# Altium schematic symbol library LATTICEPLDS_Library.SchLib: 291 symbols (part 20 of 32)
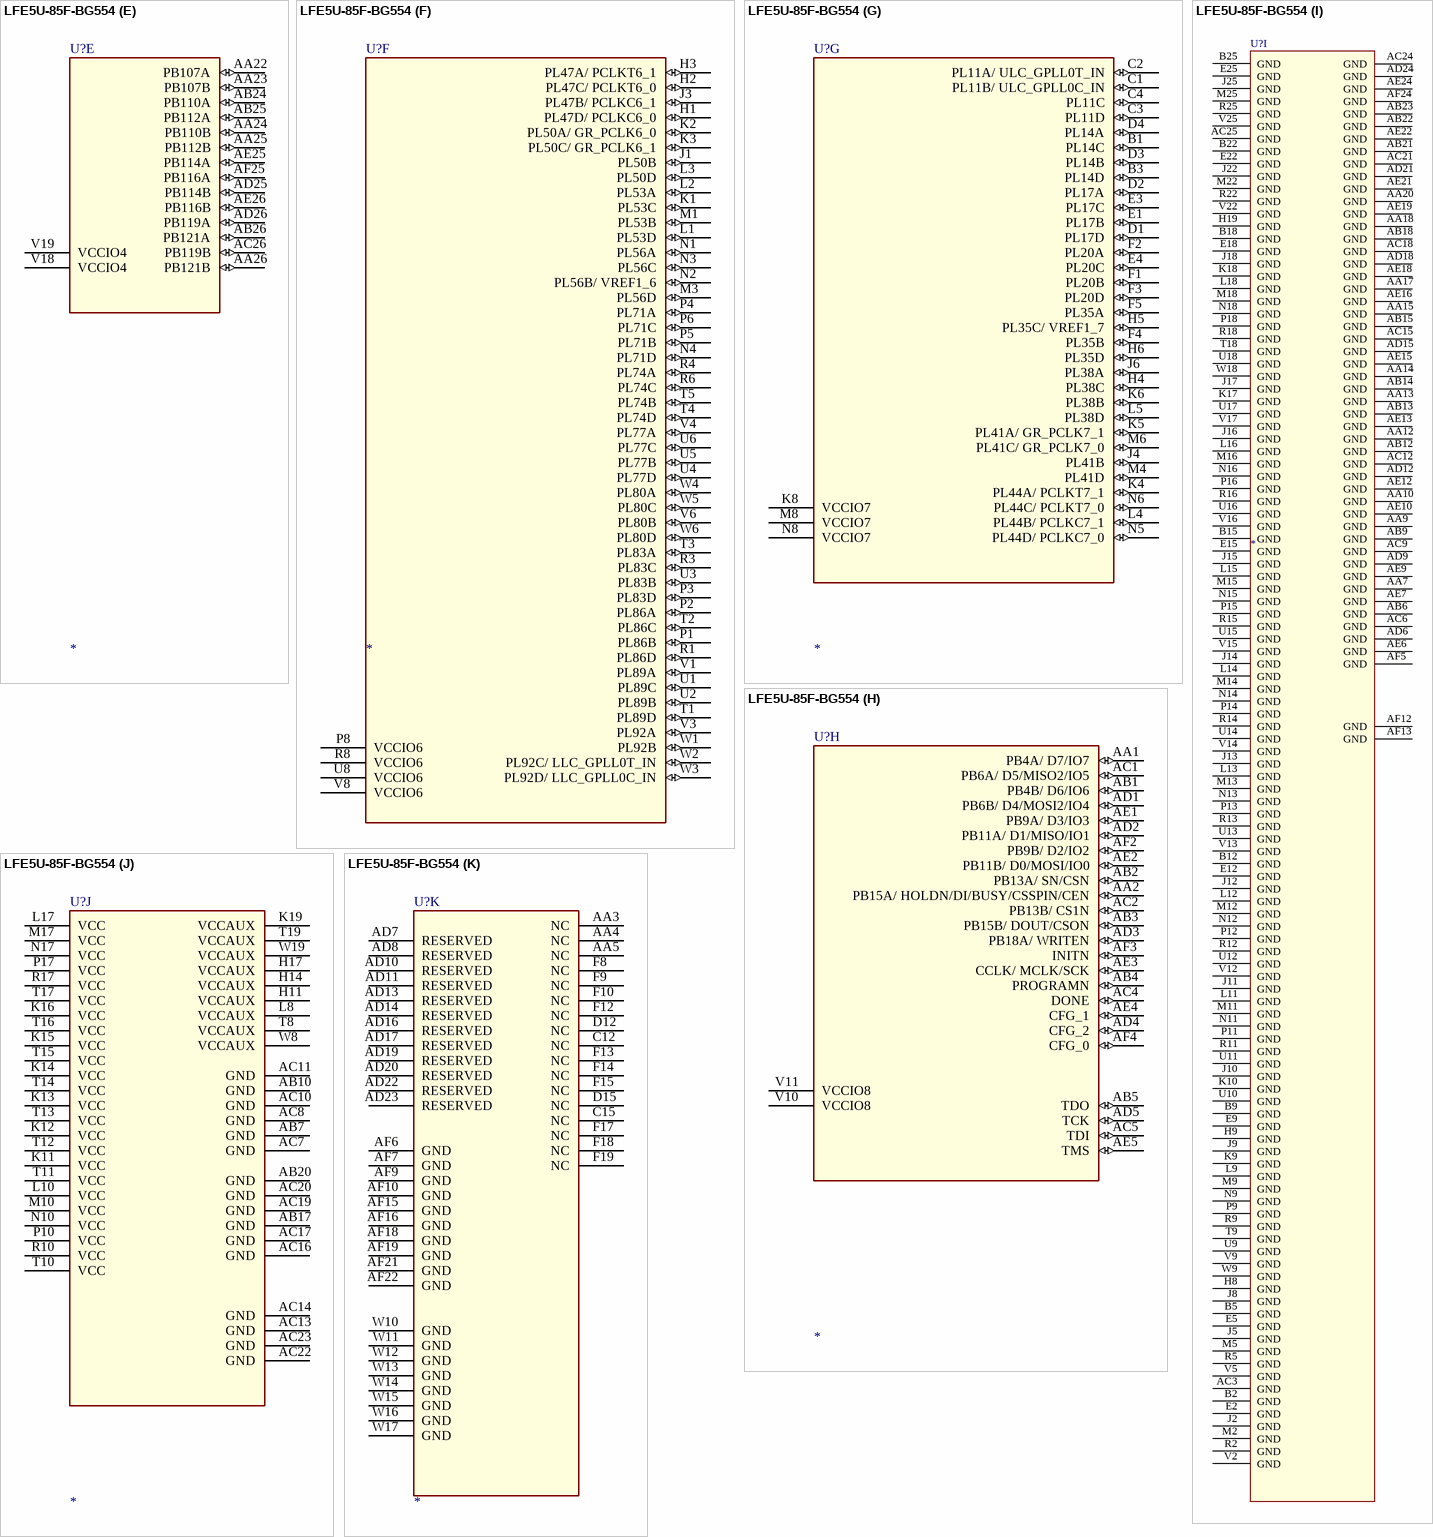
[diagram p322: symbol LFE5U-85F-BG554]

## LFE5U-85F-BG554
designator U?
SPLIT_INST: TRUE; SWAP_INFO: (S1+S2+S3+S4+S5+S6+S7+S8+S9+S10+S11)
part A pins: A2 PT4A/ ULC_GPLL1T_IN (io), A3 PT4B/ ULC_GPLL1C_IN (io), A4 PT6B (io), A5 PT15A (io), A6 PT15B (io), A8 PT18A (io), A9 PT18B (io), A10 PT58A (io), A11 PT58B (io), A12 PT65A/ PCLKT0_0 (io), A13 PT65B/ PCLKC0_0 (io), B4 PT6A (io), B6 PT13B (io), B8 PT20A (io), B10 PT56B (io), B11 PT60B/ GR_PCLK0_0 (io), C5 PT9B (io), C6 PT13A (io), C8 PT20B (io), C9 PT51B (io), C10 PT56A (io), C11 PT60A/ GR_PCLK0_1 (io), D5 PT9A (io), D6 PT11B (io), D8 PT49B (io), D9 PT51A (io), D10 PT54B (io), D11 PT63B/ PCLKC0_1 (io), E6 PT11A (io), E8 PT49A (io), E10 PT54A (io), E11 PT63A/ PCLKT0_1 (io), H10 VCCIO0 (power), H12 VCCIO0 (power), H13 VCCIO0 (power)
part B pins: A14 PT78A (io), A15 PT78B (io), A16 PT85A (io), A17 PT85B (io), A18 PT107A (io), A19 PT107B (io), A21 PT110A (io), A22 PT110B (io), A23 PT119A (io), A24 PT121A/ URC_GPLL1T_IN (io), A25 PT121B/ URC_GPLL1C_IN (io), B13 PT76A (io), B14 PT76B (io), B16 PT83A (io), B17 PT96A (io), B19 PT105B (io), B21 PT112A (io), B23 PT119B (io), C13 PT74A/ GR_PCLK1_0 (io), C14 PT74B/ GR_PCLK1_1 (io), C16 PT83B (io), C17 PT96B (io), C18 PT101A (io), C19 PT105A (io), C21 PT112B (io), C22 PT116A (io), D13 PT71A/ PCLKT1_0 (io), D14 PT71B/ PCLKC1_0 (io), D16 PT80A (io), D17 PT98A (io), D18 PT101B (io), D19 PT103B (io), D21 PT114A (io), D22 PT116B (io), E13 PT69A/ PCLKT1_1 (io), E14 PT69B/ PCLKC1_1 (io), E16 PT80B (io), E17 PT98B (io), E19 PT103A (io), E21 PT114B (io), H15 VCCIO1 (power), H16 VCCIO1 (power), H18 VCCIO1 (power)
part C pins: B24 PR14D (io), B26 PR14C (io), C23 PR11C (io), C24 PR11D (io), C25 PR11A/ URC_GPLL0T_IN (io), C26 PR11B/ URC_GPLL0C_IN (io), D23 PR14A (io), D24 PR14B (io), D25 PR17A (io), D26 PR17D (io), E23 PR20C (io), E24 PR17C (io), E26 PR17B (io), F22 PR35A (io), F23 PR35B (io), F24 PR20D (io), F25 PR20A (io), F26 PR20B (io), H21 PR35D (io), H22 PR35C/ VREF1_2 (io), H23 PR38C (io), J19 VCCIO2 (power), J21 PR38A (io), J23 PR41B (io), K21 PR38B (io), K22 PR41A/ GR_PCLK2_1 (io), K23 PR44A/ PCLKT2_1 (io), L19 VCCIO2 (power), L22 PR38D (io), L23 PR44B/ PCLKC2_1 (io), M19 VCCIO2 (power), M21 PR41C/ GR_PCLK2_0 (io), M23 PR41D (io), N19 VCCIO2 (power), N21 PR44C/ PCLKT2_0 (io), N22 PR44D/ PCLKC2_0 (io)
part D pins: H24 PR47A/ PCLKT3_1 (io), H25 PR47C/ PCLKT3_0 (io), H26 PR47D/ PCLKC3_0 (io), J24 PR47B/ PCLKC3_1 (io), J26 PR50B (io), K24 PR50C/ GR_PCLK3_1 (io), K25 PR50A/ GR_PCLK3_0 (io), K26 PR53C (io), L24 PR50D (io), L25 PR53A (io), L26 PR53D (io), M24 PR56D (io), M26 PR53B (io), N23 PR71D (io), N24 PR56C (io), N25 PR56B/ VREF1_3 (io), N26 PR56A (io), P19 VCCIO3 (power), P21 PR71C (io), P22 PR71B (io), P23 PR71A (io), P24 PR83D (io), P25 PR86A (io), P26 PR86B (io), R19 VCCIO3 (power), R21 PR74C (io), R23 PR74A (io), R24 PR83C (io), R26 PR86D (io), T22 PR74B (io), T23 PR74D (io), T24 PR83A (io), T25 PR86C (io), T26 PR89D (io), U19 VCCIO3 (power), U21 PR77C (io), U22 PR77B (io), U23 PR77D (io), U24 PR83B (io), U25 PR89B (io), U26 PR89C (io), V21 PR80B (io), V23 PR77A (io), V24 PR92A (io), V26 PR89A (io), W21 PR80D (io), W22 PR80C (io), W23 PR80A (io), W24 PR92D/ LRC_GPLL0C_IN (io), W25 PR92C/ LRC_GPLL0T_IN (io), W26 PR92B (io)
part E pins: AA22 PB107A (io), AA23 PB107B (io), AA24 PB110B (io), AA25 PB112B (io), AA26 PB121B (io), AB24 PB110A (io), AB25 PB112A (io), AB26 PB121A (io), AC26 PB119B (io), AD25 PB114B (io), AD26 PB119A (io), AE25 PB114A (io), AE26 PB116B (io), AF25 PB116A (io), V18 VCCIO4 (power), V19 VCCIO4 (power)
part F pins: H1 PL47D/ PCLKC6_0 (io), H2 PL47C/ PCLKT6_0 (io), H3 PL47A/ PCLKT6_1 (io), J1 PL50B (io), J3 PL47B/ PCLKC6_1 (io), K1 PL53C (io), K2 PL50A/ GR_PCLK6_0 (io), K3 PL50C/ GR_PCLK6_1 (io), L1 PL53D (io), L2 PL53A (io), L3 PL50D (io), M1 PL53B (io), M3 PL56D (io), N1 PL56A (io), N2 PL56B/ VREF1_6 (io), N3 PL56C (io), N4 PL71D (io), P1 PL86B (io), P2 PL86A (io), P3 PL83D (io), P4 PL71A (io), P5 PL71B (io), P6 PL71C (io), P8 VCCIO6 (power), R1 PL86D (io), R3 PL83C (io), R4 PL74A (io), R6 PL74C (io), R8 VCCIO6 (power), T1 PL89D (io), T2 PL86C (io), T3 PL83A (io), T4 PL74D (io), T5 PL74B (io), U1 PL89C (io), U2 PL89B (io), U3 PL83B (io), U4 PL77D (io), U5 PL77B (io), U6 PL77C (io), U8 VCCIO6 (power), V1 PL89A (io), V3 PL92A (io), V4 PL77A (io), V6 PL80B (io), V8 VCCIO6 (power), W1 PL92B (io), W2 PL92C/ LLC_GPLL0T_IN (io), W3 PL92D/ LLC_GPLL0C_IN (io), W4 PL80A (io), W5 PL80C (io), W6 PL80D (io)
part G pins: B1 PL14C (io), B3 PL14D (io), C1 PL11B/ ULC_GPLL0C_IN (io), C2 PL11A/ ULC_GPLL0T_IN (io), C3 PL11D (io), C4 PL11C (io), D1 PL17D (io), D2 PL17A (io), D3 PL14B (io), D4 PL14A (io), E1 PL17B (io), E3 PL17C (io), E4 PL20C (io), F1 PL20B (io), F2 PL20A (io), F3 PL20D (io), F4 PL35B (io), F5 PL35A (io), H4 PL38C (io), H5 PL35C/ VREF1_7 (io), H6 PL35D (io), J4 PL41B (io), J6 PL38A (io), K4 PL44A/ PCLKT7_1 (io), K5 PL41A/ GR_PCLK7_1 (io), K6 PL38B (io), K8 VCCIO7 (power), L4 PL44B/ PCLKC7_1 (io), L5 PL38D (io), M4 PL41D (io), M6 PL41C/ GR_PCLK7_0 (io), M8 VCCIO7 (power), N5 PL44D/ PCLKC7_0 (io), N6 PL44C/ PCLKT7_0 (io), N8 VCCIO7 (power)
part H pins: AA1 PB4A/ D7/IO7 (io), AA2 PB15A/ HOLDN/DI/BUSY/CSSPIN/CEN (io), AB1 PB4B/ D6/IO6 (io), AB2 PB13A/ SN/CSN (io), AB3 PB15B/ DOUT/CSON (io), AB4 PROGRAMN (io), AB5 TDO (io), AC1 PB6A/ D5/MISO2/IO5 (io), AC2 PB13B/ CS1N (io), AC4 DONE (io), AC5 TDI (io), AD1 PB6B/ D4/MOSI2/IO4 (io), AD2 PB11A/ D1/MISO/IO1 (io), AD3 PB18A/ WRITEN (io), AD4 CFG_2 (io), AD5 TCK (io), AE1 PB9A/ D3/IO3 (io), AE2 PB11B/ D0/MOSI/IO0 (io), AE3 CCLK/ MCLK/SCK (io), AE4 CFG_1 (io), AE5 TMS (io), AF2 PB9B/ D2/IO2 (io), AF3 INITN (io), AF4 CFG_0 (io), V10 VCCIO8 (power), V11 VCCIO8 (power)
part I pins: AA7 GND (power), AA9 GND (power), AA10 GND (power), AA12 GND (power), AA13 GND (power), AA14 GND (power), AA15 GND (power), AA17 GND (power), AA18 GND (power), AA20 GND (power), AB6 GND (power), AB9 GND (power), AB12 GND (power), AB13 GND (power), AB14 GND (power), AB15 GND (power), AB18 GND (power), AB21 GND (power), AB22 GND (power), AB23 GND (power), AC3 GND (power), AC6 GND (power), AC9 GND (power), AC12 GND (power), AC15 GND (power), AC18 GND (power), AC21 GND (power), AC24 GND (power), AC25 GND (power), AD6 GND (power), AD9 GND (power), AD12 GND (power), AD15 GND (power), AD18 GND (power), AD21 GND (power), AD24 GND (power), AE6 GND (power), AE7 GND (power), AE9 GND (power), AE10 GND (power), AE12 GND (power), AE13 GND (power), AE15 GND (power), AE16 GND (power), AE18 GND (power), AE19 GND (power), AE21 GND (power), AE22 GND (power), AE24 GND (power), AF5 GND (power), AF12 GND (power), AF13 GND (power), AF24 GND (power), B2 GND (power), B5 GND (power), B9 GND (power), B12 GND (power), B15 GND (power), B18 GND (power), B22 GND (power), B25 GND (power), E2 GND (power), E5 GND (power), E9 GND (power), E12 GND (power), E15 GND (power), E18 GND (power), E22 GND (power), E25 GND (power), H8 GND (power), H9 GND (power), H19 GND (power), J2 GND (power), J5 GND (power), J8 GND (power), J9 GND (power), J10 GND (power), J11 GND (power), J12 GND (power), J13 GND (power), J14 GND (power), J15 GND (power), J16 GND (power), J17 GND (power), J18 GND (power), J22 GND (power), J25 GND (power), K9 GND (power), K10 GND (power), K17 GND (power), K18 GND (power), L9 GND (power), L11 GND (power), L12 GND (power), L13 GND (power), L14 GND (power), L15 GND (power), L16 GND (power), L18 GND (power), M2 GND (power), M5 GND (power), M9 GND (power), M11 GND (power), M12 GND (power), M13 GND (power), M14 GND (power), M15 GND (power), M16 GND (power), M18 GND (power), M22 GND (power), M25 GND (power), N9 GND (power), N11 GND (power), N12 GND (power), N13 GND (power), N14 GND (power), N15 GND (power), N16 GND (power), N18 GND (power), P9 GND (power), P11 GND (power), P12 GND (power), P13 GND (power), P14 GND (power), P15 GND (power), P16 GND (power), P18 GND (power), R2 GND (power), R5 GND (power), R9 GND (power), R11 GND (power), R12 GND (power), R13 GND (power), R14 GND (power), R15 GND (power), R16 GND (power), R18 GND (power), R22 GND (power), R25 GND (power), T9 GND (power), T18 GND (power), U9 GND (power), U10 GND (power), U11 GND (power), U12 GND (power), U13 GND (power), U14 GND (power), U15 GND (power), U16 GND (power), U17 GND (power), U18 GND (power), V2 GND (power), V5 GND (power), V9 GND (power), V12 GND (power), V13 GND (power), V14 GND (power), V15 GND (power), V16 GND (power), V17 GND (power), V22 GND (power), V25 GND (power), W9 GND (power), W18 GND (power)
part J pins: AB7 GND (power), AB10 GND (power), AB17 GND (power), AB20 GND (power), AC7 GND (power), AC8 GND (power), AC10 GND (power), AC11 GND (power), AC13 GND (power), AC14 GND (power), AC16 GND (power), AC17 GND (power), AC19 GND (power), AC20 GND (power), AC22 GND (power), AC23 GND (power), H11 VCCAUX (power), H14 VCCAUX (power), H17 VCCAUX (power), K11 VCC (power), K12 VCC (power), K13 VCC (power), K14 VCC (power), K15 VCC (power), K16 VCC (power), K19 VCCAUX (power), L8 VCCAUX (power), L10 VCC (power), L17 VCC (power), M10 VCC (power), M17 VCC (power), N10 VCC (power), N17 VCC (power), P10 VCC (power), P17 VCC (power), R10 VCC (power), R17 VCC (power), T8 VCCAUX (power), T10 VCC (power), T11 VCC (power), T12 VCC (power), T13 VCC (power), T14 VCC (power), T15 VCC (power), T16 VCC (power), T17 VCC (power), T19 VCCAUX (power), W8 VCCAUX (power), W19 VCCAUX (power)
part K pins: AA3 NC (power), AA4 NC (power), AA5 NC (power), AD7 RESERVED (power), AD8 RESERVED (power), AD10 RESERVED (power), AD11 RESERVED (power), AD13 RESERVED (power), AD14 RESERVED (power), AD16 RESERVED (power), AD17 RESERVED (power), AD19 RESERVED (power), AD20 RESERVED (power), AD22 RESERVED (power), AD23 RESERVED (power), AF6 GND (power), AF7 GND (power), AF9 GND (power), AF10 GND (power), AF15 GND (power), AF16 GND (power), AF18 GND (power), AF19 GND (power), AF21 GND (power), AF22 GND (power), C12 NC (power), C15 NC (power), D12 NC (power), D15 NC (power), F8 NC (power), F9 NC (power), F10 NC (power), F12 NC (power), F13 NC (power), F14 NC (power), F15 NC (power), F17 NC (power), F18 NC (power), F19 NC (power), W10 GND (power), W11 GND (power), W12 GND (power), W13 GND (power), W14 GND (power), W15 GND (power), W16 GND (power), W17 GND (power)

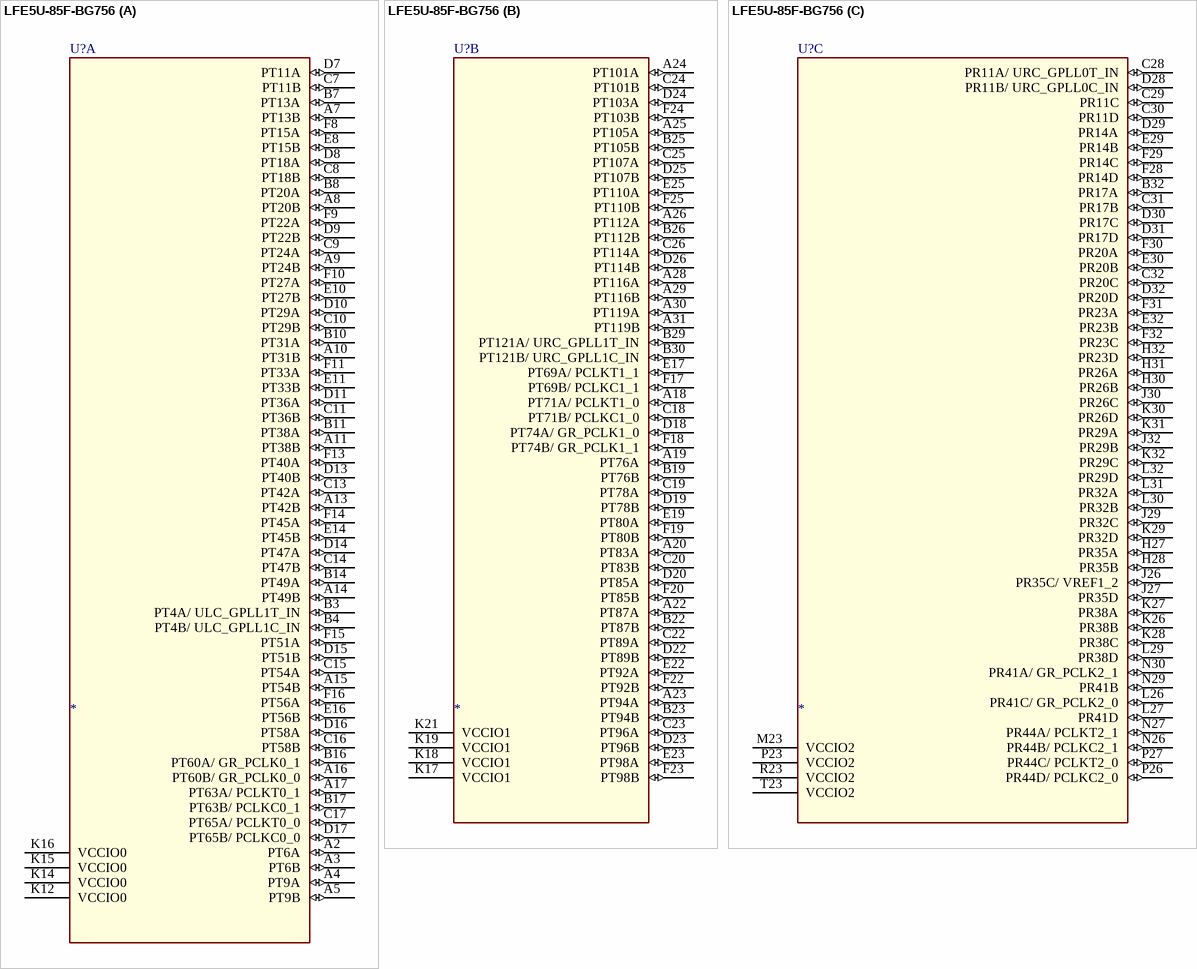
[diagram p185: symbol LFE5U-85F-BG756]

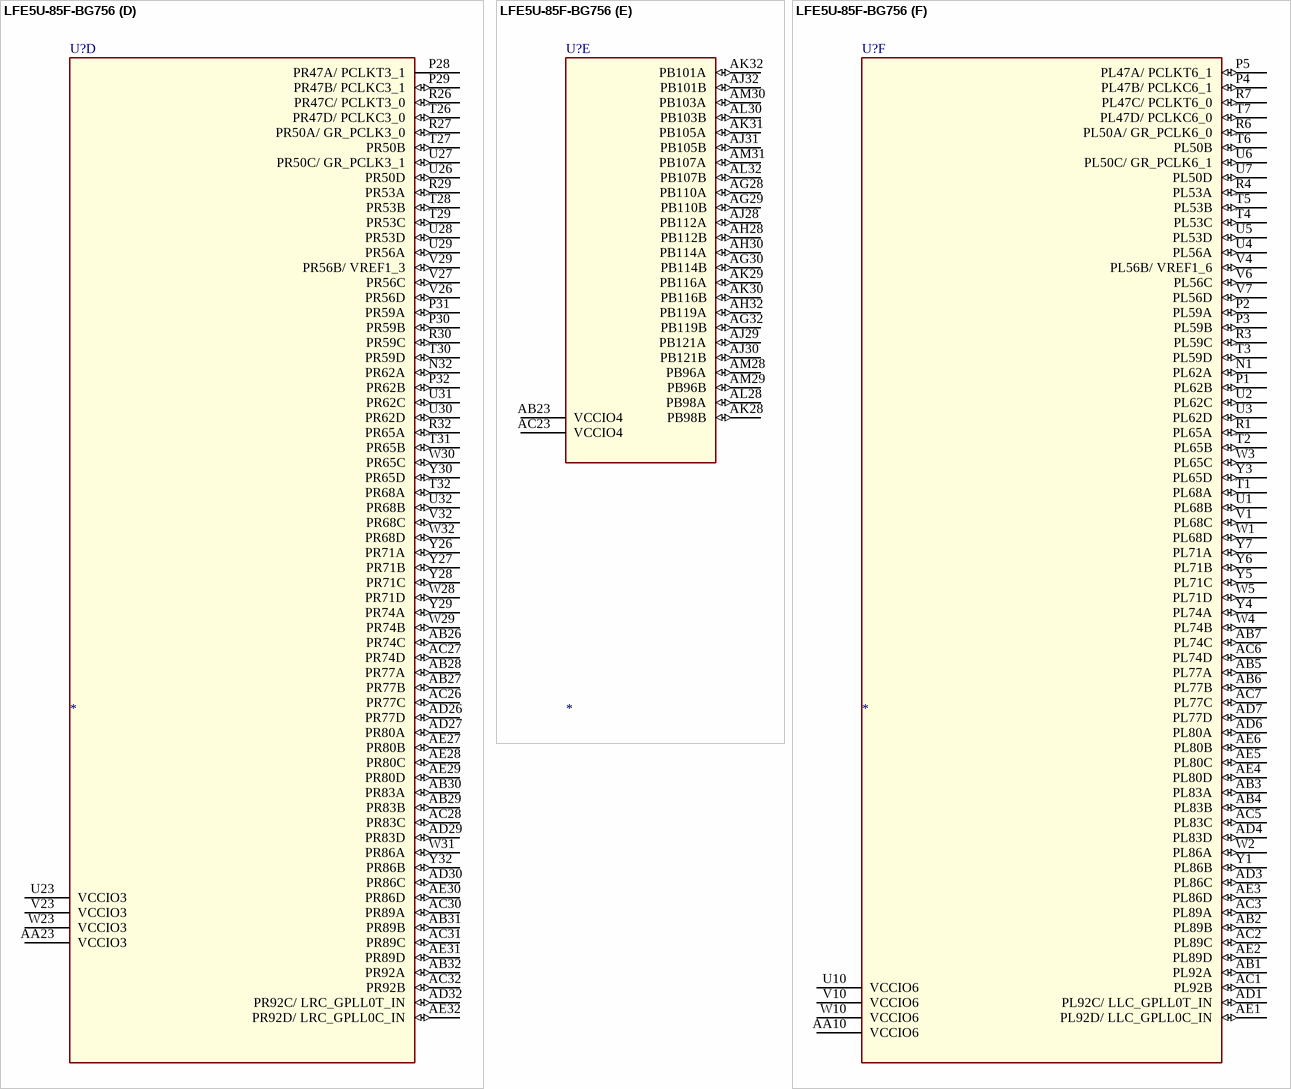
[diagram p186: symbol LFE5U-85F-BG756]

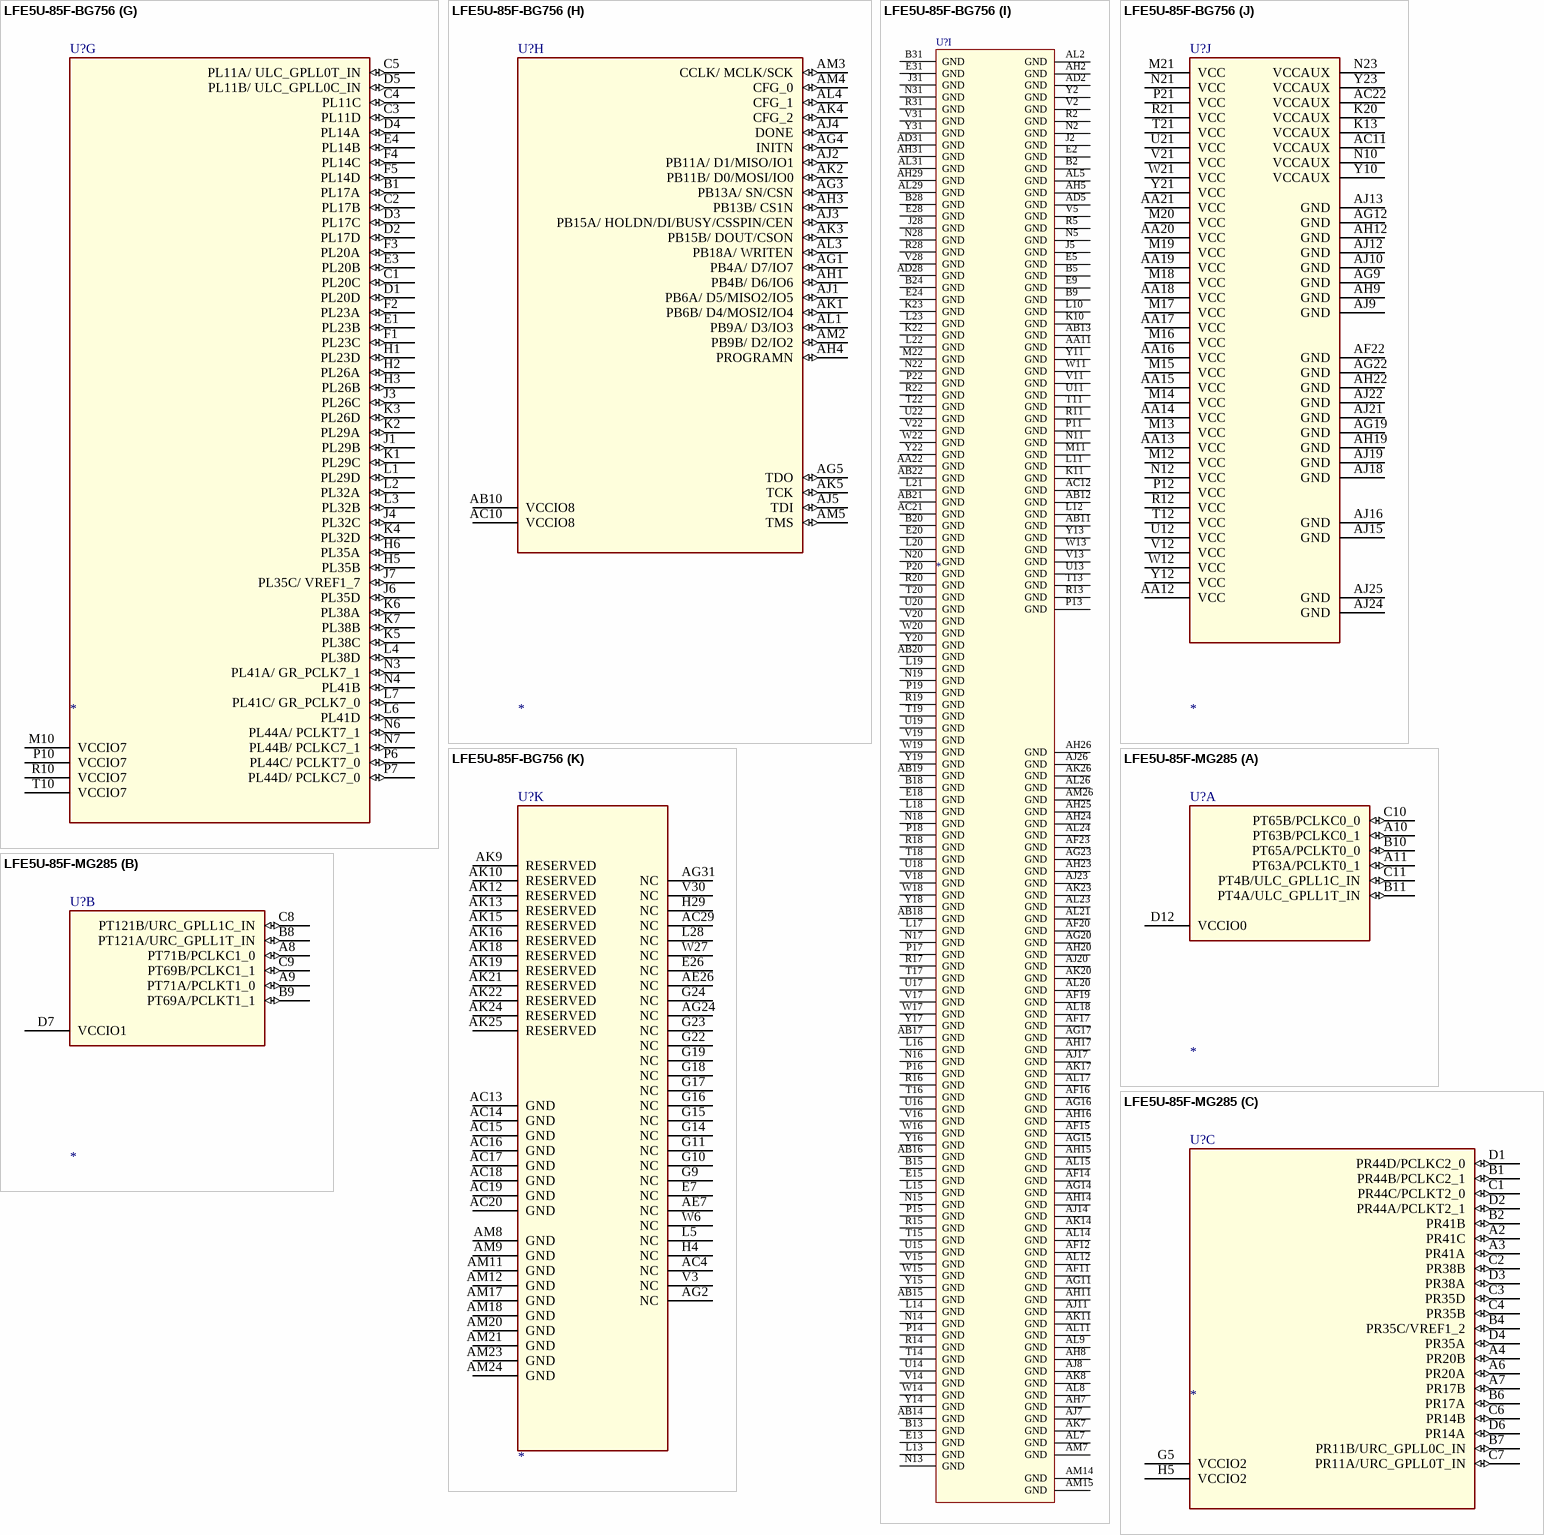
[diagram p187: symbols LFE5U-85F-BG756 to LFE5U-85F-MG285]

## LFE5U-85F-BG756
designator U?
SPLIT_INST: TRUE; SWAP_INFO: (S1+S2+S3+S4+S5+S6+S7+S8+S9+S10+S11)
part A pins: A2 PT6A (io), A3 PT6B (io), A4 PT9A (io), A5 PT9B (io), A7 PT13B (io), A8 PT20B (io), A9 PT24B (io), A10 PT31B (io), A11 PT38B (io), A13 PT42B (io), A14 PT49B (io), A15 PT54B (io), A16 PT60B/ GR_PCLK0_0 (io), A17 PT63A/ PCLKT0_1 (io), B3 PT4A/ ULC_GPLL1T_IN (io), B4 PT4B/ ULC_GPLL1C_IN (io), B7 PT13A (io), B8 PT20A (io), B10 PT31A (io), B11 PT38A (io), B14 PT49A (io), B16 PT60A/ GR_PCLK0_1 (io), B17 PT63B/ PCLKC0_1 (io), C7 PT11B (io), C8 PT18B (io), C9 PT24A (io), C10 PT29B (io), C11 PT36B (io), C13 PT42A (io), C14 PT47B (io), C15 PT54A (io), C16 PT58B (io), C17 PT65A/ PCLKT0_0 (io), D7 PT11A (io), D8 PT18A (io), D9 PT22B (io), D10 PT29A (io), D11 PT36A (io), D13 PT40B (io), D14 PT47A (io), D15 PT51B (io), D16 PT58A (io), D17 PT65B/ PCLKC0_0 (io), E8 PT15B (io), E10 PT27B (io), E11 PT33B (io), E14 PT45B (io), E16 PT56B (io), F8 PT15A (io), F9 PT22A (io), F10 PT27A (io), F11 PT33A (io), F13 PT40A (io), F14 PT45A (io), F15 PT51A (io), F16 PT56A (io), K12 VCCIO0 (power), K14 VCCIO0 (power), K15 VCCIO0 (power), K16 VCCIO0 (power)
part B pins: A18 PT71A/ PCLKT1_0 (io), A19 PT76A (io), A20 PT83A (io), A22 PT87A (io), A23 PT94A (io), A24 PT101A (io), A25 PT105A (io), A26 PT112A (io), A28 PT116A (io), A29 PT116B (io), A30 PT119A (io), A31 PT119B (io), B19 PT76B (io), B22 PT87B (io), B23 PT94B (io), B25 PT105B (io), B26 PT112B (io), B29 PT121A/ URC_GPLL1T_IN (io), B30 PT121B/ URC_GPLL1C_IN (io), C18 PT71B/ PCLKC1_0 (io), C19 PT78A (io), C20 PT83B (io), C22 PT89A (io), C23 PT96A (io), C24 PT101B (io), C25 PT107A (io), C26 PT114A (io), D18 PT74A/ GR_PCLK1_0 (io), D19 PT78B (io), D20 PT85A (io), D22 PT89B (io), D23 PT96B (io), D24 PT103A (io), D25 PT107B (io), D26 PT114B (io), E17 PT69A/ PCLKT1_1 (io), E19 PT80A (io), E22 PT92A (io), E23 PT98A (io), E25 PT110A (io), F17 PT69B/ PCLKC1_1 (io), F18 PT74B/ GR_PCLK1_1 (io), F19 PT80B (io), F20 PT85B (io), F22 PT92B (io), F23 PT98B (io), F24 PT103B (io), F25 PT110B (io), K17 VCCIO1 (power), K18 VCCIO1 (power), K19 VCCIO1 (power), K21 VCCIO1 (power)
part C pins: B32 PR17A (io), C28 PR11A/ URC_GPLL0T_IN (io), C29 PR11C (io), C30 PR11D (io), C31 PR17B (io), C32 PR20C (io), D28 PR11B/ URC_GPLL0C_IN (io), D29 PR14A (io), D30 PR17C (io), D31 PR17D (io), D32 PR20D (io), E29 PR14B (io), E30 PR20B (io), E32 PR23B (io), F28 PR14D (io), F29 PR14C (io), F30 PR20A (io), F31 PR23A (io), F32 PR23C (io), H27 PR35A (io), H28 PR35B (io), H30 PR26B (io), H31 PR26A (io), H32 PR23D (io), J26 PR35C/ VREF1_2 (io), J27 PR35D (io), J29 PR32C (io), J30 PR26C (io), J32 PR29B (io), K26 PR38B (io), K27 PR38A (io), K28 PR38C (io), K29 PR32D (io), K30 PR26D (io), K31 PR29A (io), K32 PR29C (io), L26 PR41C/ GR_PCLK2_0 (io), L27 PR41D (io), L29 PR38D (io), L30 PR32B (io), L31 PR32A (io), L32 PR29D (io), M23 VCCIO2 (power), N26 PR44B/ PCLKC2_1 (io), N27 PR44A/ PCLKT2_1 (io), N29 PR41B (io), N30 PR41A/ GR_PCLK2_1 (io), P23 VCCIO2 (power), P26 PR44D/ PCLKC2_0 (io), P27 PR44C/ PCLKT2_0 (io), R23 VCCIO2 (power), T23 VCCIO2 (power)
part D pins: AA23 VCCIO3 (power), AB26 PR74C (io), AB27 PR77B (io), AB28 PR77A (io), AB29 PR83B (io), AB30 PR83A (io), AB31 PR89B (io), AB32 PR92A (io), AC26 PR77C (io), AC27 PR74D (io), AC28 PR83C (io), AC30 PR89A (io), AC31 PR89C (io), AC32 PR92B (io), AD26 PR77D (io), AD27 PR80A (io), AD29 PR83D (io), AD30 PR86C (io), AD32 PR92C/ LRC_GPLL0T_IN (io), AE27 PR80B (io), AE28 PR80C (io), AE29 PR80D (io), AE30 PR86D (io), AE31 PR89D (io), AE32 PR92D/ LRC_GPLL0C_IN (io), N32 PR62A (io), P28 PR47A/ PCLKT3_1 (power), P29 PR47B/ PCLKC3_1 (io), P30 PR59B (io), P31 PR59A (io), P32 PR62B (io), R26 PR47C/ PCLKT3_0 (io), R27 PR50A/ GR_PCLK3_0 (io), R29 PR53A (io), R30 PR59C (io), R32 PR65A (io), T26 PR47D/ PCLKC3_0 (io), T27 PR50B (io), T28 PR53B (io), T29 PR53C (io), T30 PR59D (io), T31 PR65B (io), T32 PR68A (io), U23 VCCIO3 (power), U26 PR50D (io), U27 PR50C/ GR_PCLK3_1 (io), U28 PR53D (io), U29 PR56A (io), U30 PR62D (io), U31 PR62C (io), U32 PR68B (io), V23 VCCIO3 (power), V26 PR56D (io), V27 PR56C (io), V29 PR56B/ VREF1_3 (io), V32 PR68C (io), W23 VCCIO3 (power), W28 PR71D (io), W29 PR74B (io), W30 PR65C (io), W31 PR86A (io), W32 PR68D (io), Y26 PR71A (io), Y27 PR71B (io), Y28 PR71C (io), Y29 PR74A (io), Y30 PR65D (io), Y32 PR86B (io)
part E pins: AB23 VCCIO4 (power), AC23 VCCIO4 (power), AG28 PB110A (io), AG29 PB110B (io), AG30 PB114B (io), AG32 PB119B (io), AH28 PB112B (io), AH30 PB114A (io), AH32 PB119A (io), AJ28 PB112A (io), AJ29 PB121A (io), AJ30 PB121B (io), AJ31 PB105B (io), AJ32 PB101B (io), AK28 PB98B (io), AK29 PB116A (io), AK30 PB116B (io), AK31 PB105A (io), AK32 PB101A (io), AL28 PB98A (io), AL30 PB103B (io), AL32 PB107B (io), AM28 PB96A (io), AM29 PB96B (io), AM30 PB103A (io), AM31 PB107A (io)
part F pins: AA10 VCCIO6 (power), AB1 PL92A (io), AB2 PL89B (io), AB3 PL83A (io), AB4 PL83B (io), AB5 PL77A (io), AB6 PL77B (io), AB7 PL74C (io), AC1 PL92B (io), AC2 PL89C (io), AC3 PL89A (io), AC5 PL83C (io), AC6 PL74D (io), AC7 PL77C (io), AD1 PL92C/ LLC_GPLL0T_IN (io), AD3 PL86C (io), AD4 PL83D (io), AD6 PL80A (io), AD7 PL77D (io), AE1 PL92D/ LLC_GPLL0C_IN (io), AE2 PL89D (io), AE3 PL86D (io), AE4 PL80D (io), AE5 PL80C (io), AE6 PL80B (io), N1 PL62A (io), P1 PL62B (io), P2 PL59A (io), P3 PL59B (io), P4 PL47B/ PCLKC6_1 (io), P5 PL47A/ PCLKT6_1 (io), R1 PL65A (io), R3 PL59C (io), R4 PL53A (io), R6 PL50A/ GR_PCLK6_0 (io), R7 PL47C/ PCLKT6_0 (io), T1 PL68A (io), T2 PL65B (io), T3 PL59D (io), T4 PL53C (io), T5 PL53B (io), T6 PL50B (io), T7 PL47D/ PCLKC6_0 (io), U1 PL68B (io), U2 PL62C (io), U3 PL62D (io), U4 PL56A (io), U5 PL53D (io), U6 PL50C/ GR_PCLK6_1 (io), U7 PL50D (io), U10 VCCIO6 (power), V1 PL68C (io), V4 PL56B/ VREF1_6 (io), V6 PL56C (io), V7 PL56D (io), V10 VCCIO6 (power), W1 PL68D (io), W2 PL86A (io), W3 PL65C (io), W4 PL74B (io), W5 PL71D (io), W10 VCCIO6 (power), Y1 PL86B (io), Y3 PL65D (io), Y4 PL74A (io), Y5 PL71C (io), Y6 PL71B (io), Y7 PL71A (io)
part G pins: B1 PL17A (io), C1 PL20C (io), C2 PL17B (io), C3 PL11D (io), C4 PL11C (io), C5 PL11A/ ULC_GPLL0T_IN (io), D1 PL20D (io), D2 PL17D (io), D3 PL17C (io), D4 PL14A (io), D5 PL11B/ ULC_GPLL0C_IN (io), E1 PL23B (io), E3 PL20B (io), E4 PL14B (io), F1 PL23C (io), F2 PL23A (io), F3 PL20A (io), F4 PL14C (io), F5 PL14D (io), H1 PL23D (io), H2 PL26A (io), H3 PL26B (io), H5 PL35B (io), H6 PL35A (io), J1 PL29B (io), J3 PL26C (io), J4 PL32C (io), J6 PL35D (io), J7 PL35C/ VREF1_7 (io), K1 PL29C (io), K2 PL29A (io), K3 PL26D (io), K4 PL32D (io), K5 PL38C (io), K6 PL38A (io), K7 PL38B (io), L1 PL29D (io), L2 PL32A (io), L3 PL32B (io), L4 PL38D (io), L6 PL41D (io), L7 PL41C/ GR_PCLK7_0 (io), M10 VCCIO7 (power), N3 PL41A/ GR_PCLK7_1 (io), N4 PL41B (io), N6 PL44A/ PCLKT7_1 (io), N7 PL44B/ PCLKC7_1 (io), P6 PL44C/ PCLKT7_0 (io), P7 PL44D/ PCLKC7_0 (io), P10 VCCIO7 (power), R10 VCCIO7 (power), T10 VCCIO7 (power)